# Altium footprint library 2.52-直插元件.PcbLib: 467 footprints (part 6 of 30)
Each footprint in its own frame and in the unit in brackets; x right, y up, seen from the top. Pads: shape width x height; smd on the part's side, far side on the other; paste and mask are expansions set on the pad; w line width, h text height; cw(c..) or ccw(c..) is an arc to the next point about the centre after c.
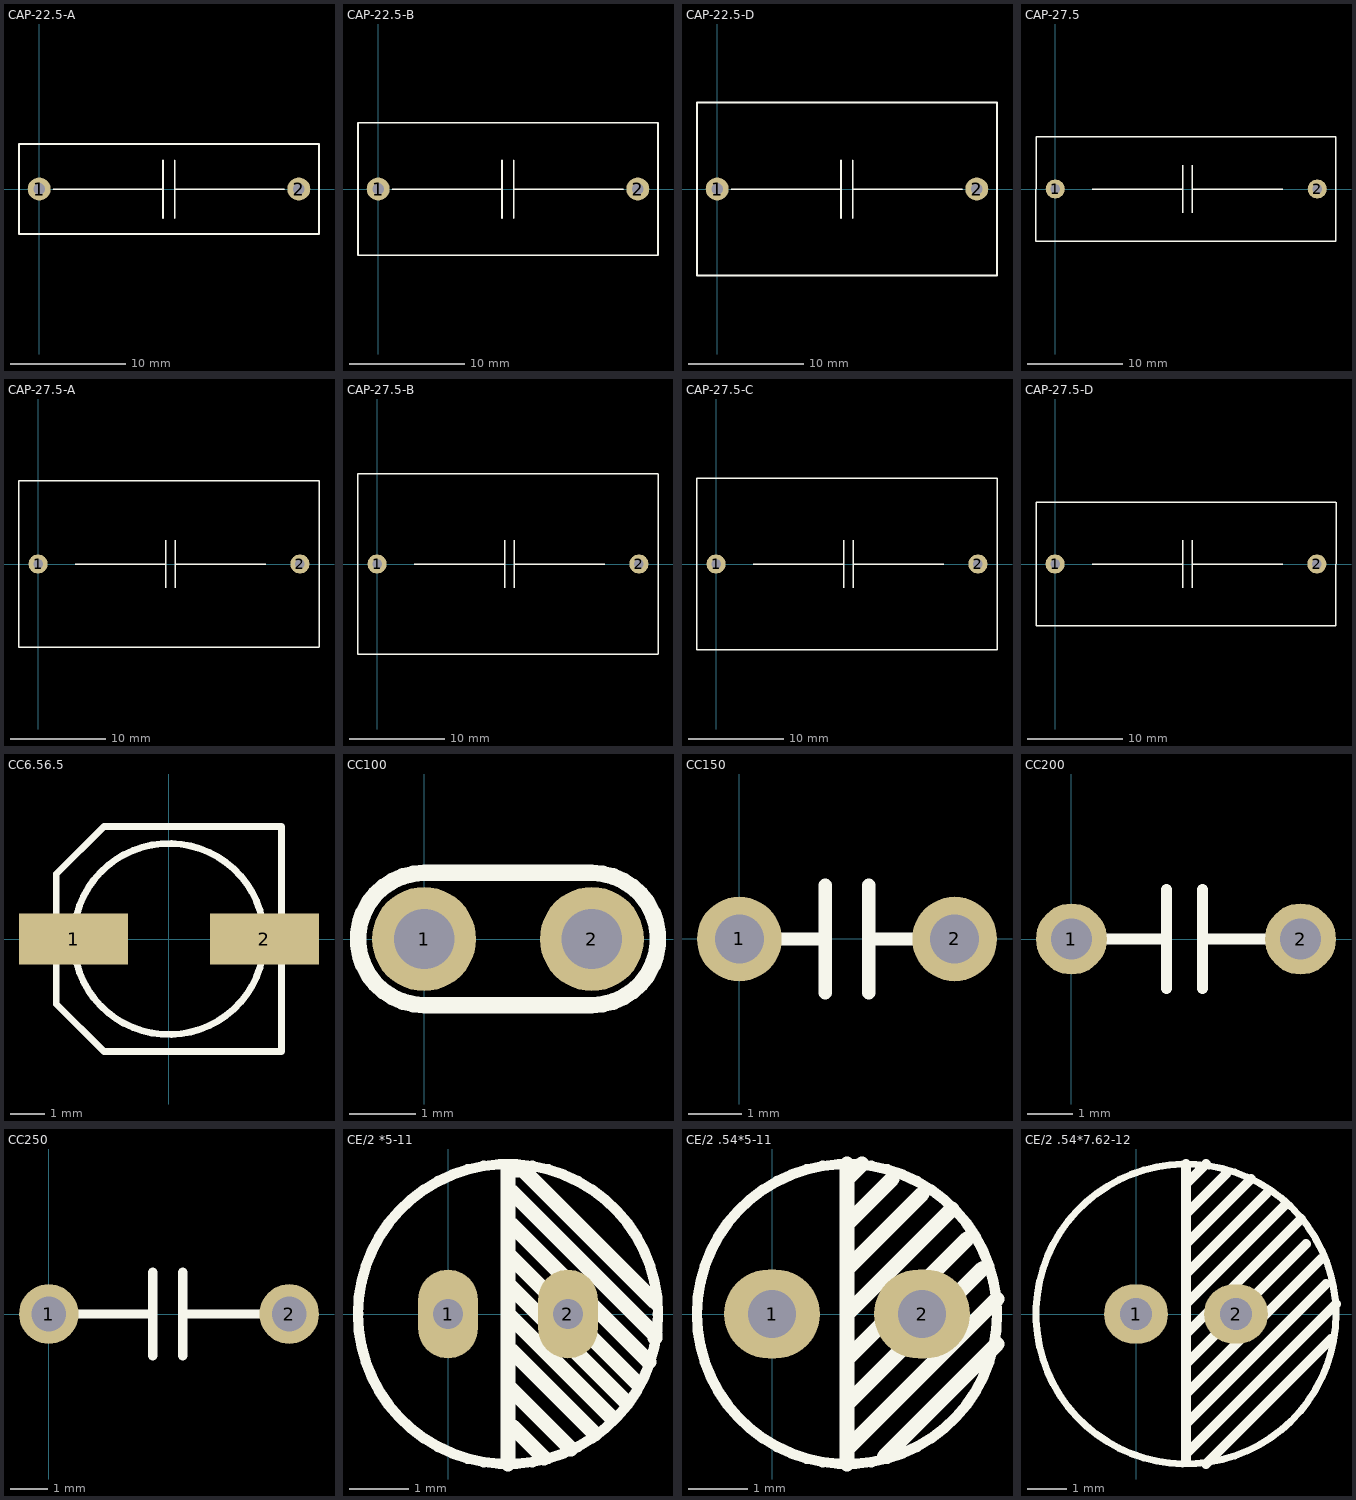
[diagram p5: the footprints below, top view; thin cyan lines are the x and y axes]

## CAP-22.5-A [mm]
pads (2):
  round 2 hole 1: 1(0,0) 2(22.5,0)
Top Overlay:
  lines w0.15: 1.237,-0.023 10.737,-0.023 ; 10.737,-2.523 10.737,2.477 ; 11.737,-2.523 11.737,2.477 ; 11.737,-0.023 21.237,-0.023 ; -1.75,-3.9 24.25,-3.9 24.25,3.9 -1.75,3.9 -1.75,-3.9
3D body "User Library-ECQE(F) 0_33uf 630Vdc 250Vac.step": height 18, standoff -4, extent -1.75,-3.9 24.25,3.9

## CAP-22.5-B [mm]
pads (2):
  round 2 hole 1: 1(0,0) 2(22.5,0)
Top Overlay:
  lines w0.15: 1.237,-0.023 10.737,-0.023 ; 10.737,-2.523 10.737,2.477 ; 11.737,-2.523 11.737,2.477 ; 11.737,-0.023 21.237,-0.023 ; -1.75,-5.75 -1.75,5.75 24.25,5.75 24.25,-5.75 -1.75,-5.75
3D body "User Library-ECQE(F) 0_68uf 630Vdc 250Vac.step": height 22, standoff -4, extent -1.75,-5.75 24.25,5.75

## CAP-22.5-D [mm]
pads (2):
  round 2 hole 1: 1(0,0) 2(22.5,0)
Top Overlay:
  lines w0.15: 1.237,-0.023 10.737,-0.023 ; 10.737,-2.523 10.737,2.477 ; 11.737,-2.523 11.737,2.477 ; 11.737,-0.023 21.237,-0.023 ; -1.75,-7.5 24.25,-7.5 24.25,7.5 -1.75,7.5 -1.75,-7.5
3D body "User Library-ECQE(F) 1_5uf 630Vdc 250Vac.step": height 25.7, standoff -4, extent -1.75,-7.65 24.25,7.65

## CAP-27.5 [mm]
pads (2):
  round 2 hole 1: 1(0,0) 2(27.5,0)
Top Overlay:
  lines w0.15: 3.901,0 13.401,0 ; 13.401,-2.5 13.401,2.5 ; 14.401,-2.5 14.401,2.5 ; 14.401,0 23.901,0 ; -2.023,-5.5 -2.011,5.5 29.468,5.5 29.464,-5.5 -2.023,-5.5
3D body "User Library-B32924E3225M.step": height 21, standoff -1.5, extent -2.021,-5.5 29.479,5.5

## CAP-27.5-A [mm]
pads (2):
  round 2 hole 1: 1(0,0) 2(27.5,0)
Top Overlay:
  lines w0.15: 3.901,0 13.401,0 ; 13.401,-2.5 13.401,2.5 ; 14.401,-2.5 14.401,2.5 ; 14.401,0 23.901,0 ; 29.487,-8.75 -2,-8.75 -2,8.75 29.5,8.75 29.5,-8.75
3D body "User Library-WIMA Capacitor.step": height 29, standoff -2.5, extent -2.007,-8.5 29.493,8.5

## CAP-27.5-B [mm]
pads (2):
  round 2 hole 1: 1(0,0) 2(27.5,0)
Top Overlay:
  lines w0.15: 3.901,0 13.401,0 ; 13.401,-2.5 13.401,2.5 ; 14.401,-2.5 14.401,2.5 ; 14.401,0 23.901,0 ; 29.487,-9.5 -2,-9.5 -2,9.5 29.5,9.5 29.5,-9.5
3D body "User Library-B81131(19_30_31).step": height 30, standoff -1.5, extent -2,-9.5 29.5,9.5

## CAP-27.5-C [mm]
pads (2):
  round 2 hole 1: 1(0,0) 2(27.5,0)
Top Overlay:
  lines w0.15: 3.901,0 13.401,0 ; 13.401,-2.5 13.401,2.5 ; 14.401,-2.5 14.401,2.5 ; 14.401,0 23.901,0 ; -2,-9 -2,9 29.5,9 29.5,-9 -2,-9
3D body "User Library-B32924F3565.step": height 1.5, standoff -33, extent -2,-9 29.5,9

## CAP-27.5-D [mm] "淘宝ID:黄晶宝石   店铺网址:https://shop463601444.taobao.com"
pads (2):
  round 2 hole 1: 1(0,0) 2(27.5,0)
Top Overlay:
  lines w0.15: 3.901,0 13.401,0 ; 13.401,-2.5 13.401,2.5 ; 14.401,-2.5 14.401,2.5 ; 14.401,0 23.901,0 ; 29.5,6.5 -2,6.5 -2,-6.5 29.5,-6.5 29.505,6.5
3D body "CAP-27.5.STEP": height 1.05, standoff -22.45, extent -2,-6.5 29.5,6.5

## CC6.56.5 [mm]
pads (2):
  rect 3.2x1.5 smd: 1(-2.794,0) 2(2.8,0)
Top Overlay:
  circle w0.2: c0,0 r2.8
  lines w0.2: -3.302,-1.905 -1.905,-3.302 3.302,-3.302 3.302,3.302 -1.905,3.302 -3.302,1.905 -3.302,-1.905

## CC100 [mil]
pads (2):
  round 62 hole 36: 1(0,0) 2(100,0)
Top Overlay:
  lines w9.84: 0,-39.37 cw(c0,0) 0,39.37 100,39.37 cw(c100,0) 100,-39.37 0,-39.37

## CC150 [mil]
pads (2):
  round 62 hole 36: 1(0,0) 2(157.48,0)
Top Overlay:
  lines w9.84: 19.68,0 62.99,0 ; 62.99,-39.37 62.99,39.37 ; 94.49,-39.37 94.49,39.37 ; 94.49,0 137.79,0

## CC200 [mil]
pads (2):
  round 62 hole 36: 1(0,0) 2(200,0)
Top Overlay:
  lines w9.84: 0,0 82.99,0 ; 82.99,-43.31 82.99,43.31 ; 114.49,-43.31 114.49,43.31 ; 114.49,0 200,0

## CC250 [mil]
pads (2):
  round 62 hole 36: 1(0,0) 2(250,0)
Top Overlay:
  lines w9.84: 25,0 107.99,0 ; 107.99,-43.31 107.99,43.31 ; 139.49,-43.31 139.49,43.31 ; 139.49,0 225,0

## CE/2 *5-11 [mil]
pads (2):
  oval 40x59.06 hole 20: 1(0,0) 2(80,0)
Top Overlay:
  circle w7: c40,0 r100
  lines w10: 40,-100 40,96 ; 40,0 109,-69 ; 40,20 118,-58 ; 40,40 126,-46 ; 41,-49 82,-90 ; 42,-24 98,-80 ; 42,60 134,-32 ; 42,82 138,-14 138,-16 ; 43,-75 64,-96 ; 44,96 50,96 138,8
3D body "SW3DPS-ELECTROLITIC CAPACITOR RADIAL 5X11-DEFAULT.STEP": height 433.07, standoff -98.43, extent -58,-98 138.85,98.85

## CE/2 .54*5-11 [mil]
pads (2):
  oval 64x59.06 hole 32: 1(0,0) 2(100,0)
Top Overlay:
  circle w7: c50,0 r100
  lines w10: 50,-100 50,100 ; 50,-90 150,10 ; 50,-60 140,30 ; 50,-30 130,50 ; 50,0 120,70 ; 50,30 100,80 ; 50,60 80,90 ; 50,90 60,100 ; 75,-95 150,-20
3D body "SW3DPS-ELECTROLITIC CAPACITOR RADIAL 5X11-DEFAULT.STEP": height 433.07, standoff -98.43, extent -48,-98 148.85,98.85

## CE/2 .54*7.62-12 [mil]
pads (2):
  oval 64x59.06 hole 32: 1(0,0) 2(100,0)
Top Overlay:
  circle w7: c50,0 r150
  lines w10: 50,-145 50,150 ; 50,-140 190,0 200,10 ; 50,-110 190,30 ; 50,-80 180,50 185,55 ; 50,-50 170,70 ; 50,-20 160,90 165,95 ; 50,10 150,110 ; 50,40 130,120 ; 50,70 110,130 115,135 ; 50,100 90,140 ; 50,130 70,150 ; 70,-150 190,-30 195,-25
3D body "User Library-CapAluRadial_D80H115.STEP": height 137.8, standoff -492.13, extent -116.61,-168.61 216.61,165